# Altium footprint library Connectors.PcbLib: 408 footprints (part 1 of 26)
Each footprint in its own frame and in the unit in brackets; x right, y up, seen from the top. Pads: shape width x height; smd on the part's side, far side on the other; paste and mask are expansions set on the pad; w line width, h text height; cw(c..) or ccw(c..) is an arc to the next point about the centre after c.
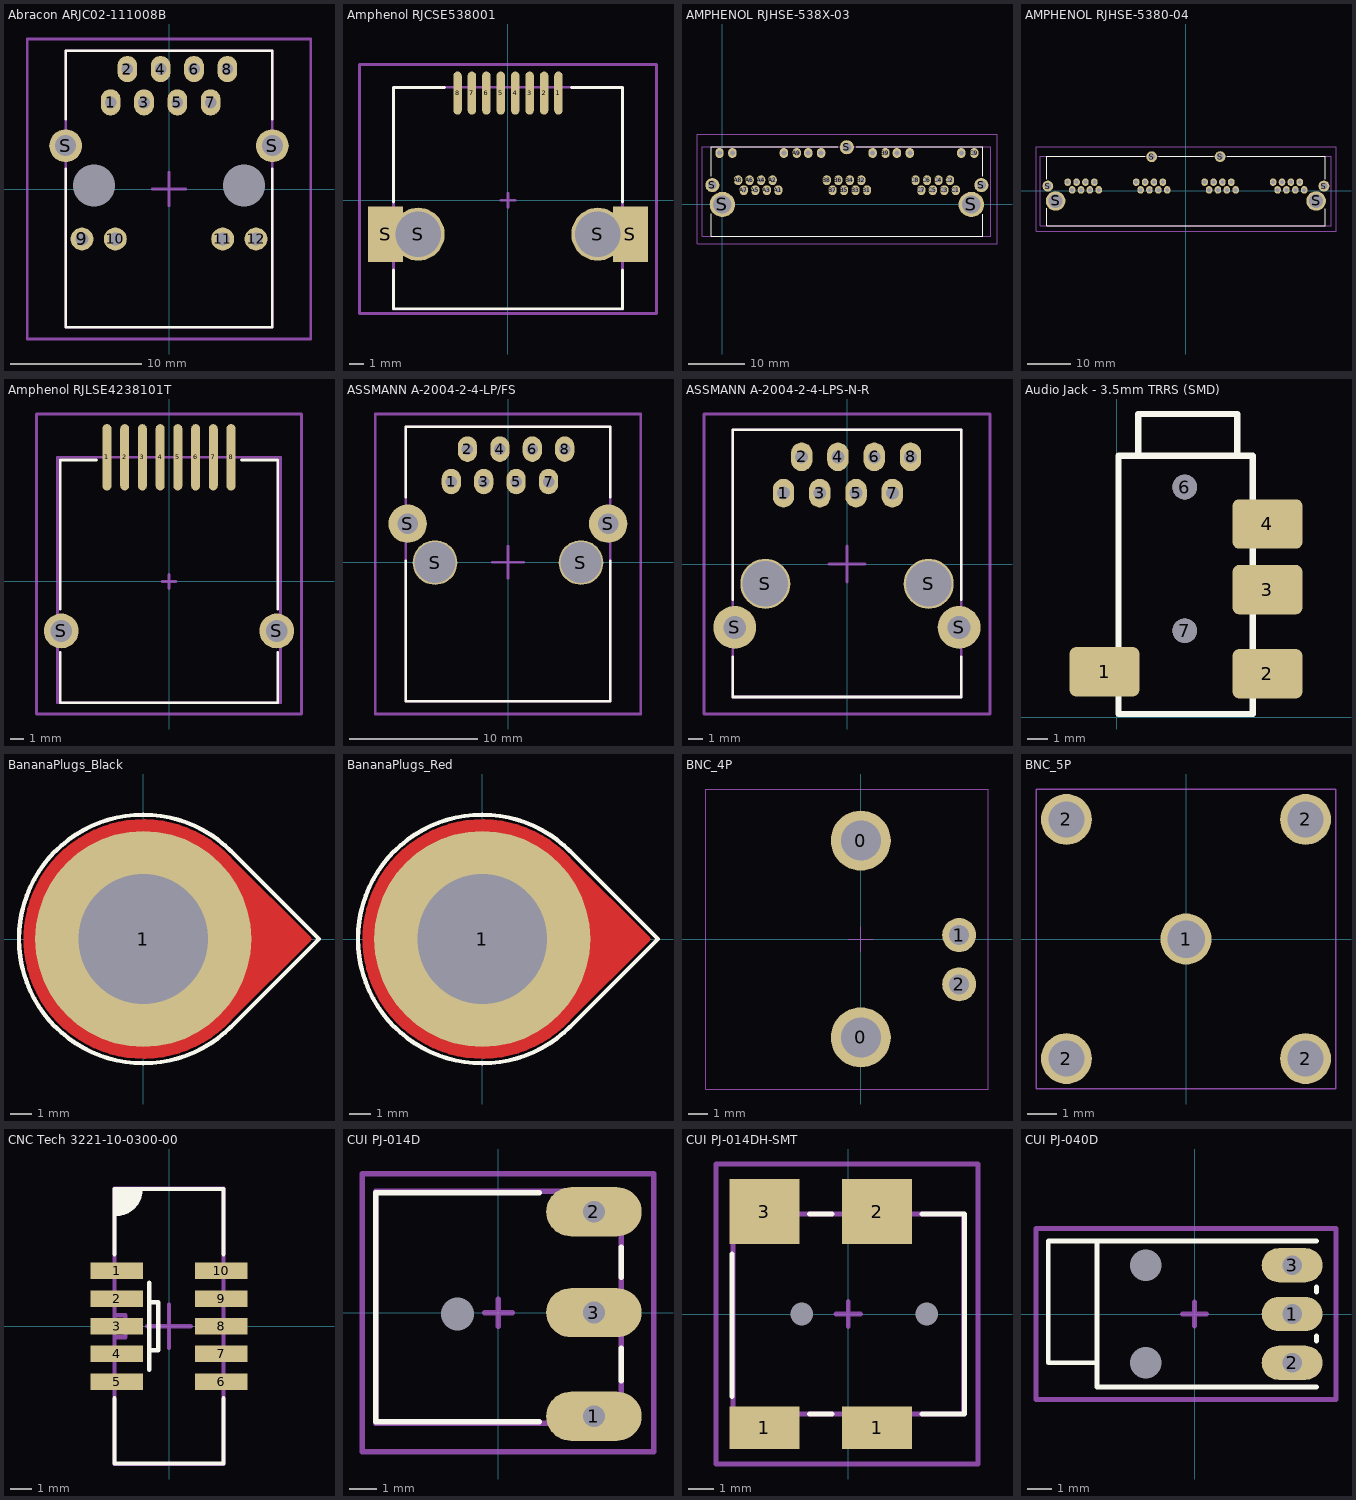
[diagram p0: the footprints below, top view; thin cyan lines are the x and y axes]

## Abracon ARJC02-111008B [mm]
height 13.55
pads (16):
  oval 1.5x2 hole 0.9: 1(-4.445,6.6) 2(-3.175,9.14) 3(-1.905,6.6) 4(-0.635,9.14) 5(0.635,6.6) 6(1.905,9.14) 7(3.175,6.6) 8(4.445,9.14)
  round 1.75 hole 1.02: 9(-6.63,-3.81) 10(-4.09,-3.81) 11(4.09,-3.81) 12(6.63,-3.81)
  round 0 hole 3.2 unplated: M(-5.715,0.25) M(5.715,0.25)
  round 2.5 hole 1.6: S(-7.875,3.3) S(7.875,3.3)
Top Overlay:
  lines w0.2: -7.874,1.52 -7.874,-10.545 0,-10.545 7.874,-10.545 7.874,1.52 ; -7.874,5.33 -7.874,10.537 0,10.537 7.874,10.537 7.874,5.33
Mechanical 1:
  lines w0.2: -7.874,-10.545 7.874,-10.545 7.874,10.537 -7.874,10.537 -7.874,-10.545
Mechanical 15:
  lines w0.2: -1.27,0 1.27,0 ; 0,-1.27 0,1.27 ; -10.795,-11.43 10.795,-11.43 10.795,11.43 -10.795,11.43 -10.795,-11.43
3D body "Abracon ARJC02-111008B.STEP": height 16.07, standoff -3.7, extent -10.336,-10.555 10.336,10.546

## Amphenol RJCSE538001 [mm]
height 13.46
pads (12):
  oval 0.6x3.05 smd: 1(3.57,7.58) 2(2.55,7.58) 3(1.53,7.58) 4(0.51,7.58) 5(-0.51,7.58) 6(-1.53,7.58) 7(-2.55,7.58) 8(-3.57,7.58)
  rect 2.5x3.9 smd: S(-8.66,-2.4) S(8.66,-2.4)
  round 3.75 hole 3.25: S(-6.35,-2.4) S(6.35,-2.4)
Top Overlay:
  lines w0.2: -8.1,-4.92 -8.1,-7.67 0,-7.67 8.1,-7.67 8.1,-4.92 ; -8.1,-0.12 -8.1,7.98 -4.5,7.98 ; 4.5,7.98 8.1,7.98 8.1,-0.12
Mechanical 13:
  lines w0.2: -8.1,-7.7 8.1,-7.7 8.1,8 -8.1,8 -8.1,-7.7
Mechanical 15:
  lines w0.2: -0.5,0 0.5,0 ; 0,-0.5 0,0.5 ; -10.5,-8 -10.5,9.6 10.5,9.6 10.5,-8 -10.5,-8
3D body "Amphenol RJCSE538001.STEP": height 14.77, standoff -1.27, extent -9.43,-7.66 9.43,8.875

## AMPHENOL RJHSE-538X-03 [mm]
height 13.46
pads (41):
  oval 1.5x1.75 hole 0.9: A1(9.93,2.54) A2(8.91,4.32) A3(7.89,2.54) A4(6.87,4.32) A5(5.85,2.54) A6(4.83,4.32) A7(3.81,2.54) A8(2.79,4.32) A9(13.21,9.14) A10(10.92,9.14) A11(1.78,9.14) A12(-0.51,9.14) B1(25.68,2.54) B2(24.66,4.32) B3(23.64,2.54) B4(22.62,4.32) B5(21.6,2.54) B6(20.58,4.32) B7(19.56,2.54) B8(18.54,4.32) B9(28.96,9.14) B10(26.67,9.14) B11(17.53,9.14) B12(15.24,9.14) C1(41.43,2.54) C2(40.41,4.32) C3(39.39,2.54) C4(38.37,4.32) C5(37.35,2.54) C6(36.33,4.32) C7(35.31,2.54) C8(34.29,4.32) C9(44.71,9.14) C10(42.42,9.14) C11(33.28,9.14) C12(30.99,9.14)
  round 2.5 hole 1.57: S(-1.78,3.43) S(22.1,10.16) S(45.98,3.43)
  round 4.5 hole 3.25: S(0,0) S(44.2,0)
Top Overlay:
  lines w0.2: -2,-1.675 -2,-5.65 46.25,-5.65 ; -2,5 -2,10.25 20.5,10.25 ; 23.75,10.25 46.25,10.25 ; 46.26,-5.65 46.26,-1.75 ; 46.26,5 46.26,10.25 ; 20.5,10.25 20.5,10.25
Mechanical 1:
  lines w0.2: 47.67,10.25 -3.525,10.25 -3.525,-5.65 47.686,-5.65 47.686,10.235
Mechanical 15:
  lines w0.2: -4.5,-7 -4.5,12.5 48.76,12.5 48.76,-7 -4.5,-7
3D body "Amphenol RJHSE-538X-03-REVT1.STEP": height 14.47, standoff -4.44, extent -3.345,-6.108 47.825,10.481

## AMPHENOL RJHSE-5380-04 [mm]
height 13.46
pads (38):
  oval 1.5x1.75 hole 0.9: A1(-20.04,0.24) A2(-21.06,2.02) A3(-22.08,0.24) A4(-23.1,2.02) A5(-24.12,0.24) A6(-25.14,2.02) A7(-26.16,0.24) A8(-27.18,2.02) B1(-4.29,0.24) B2(-5.31,2.02) B3(-6.33,0.24) B4(-7.35,2.02) B5(-8.37,0.24) B6(-9.39,2.02) B7(-10.41,0.24) B8(-11.43,2.02) C1(11.46,0.24) C2(10.44,2.02) C3(9.42,0.24) C4(8.4,2.02) C5(7.38,0.24) C6(6.36,2.02) C7(5.34,0.24) C8(4.32,2.02) D1(27.21,0.24) D2(26.19,2.02) D3(25.17,0.24) D4(24.15,2.02) D5(23.13,0.24) D6(22.11,2.02) D7(21.09,0.24) D8(20.07,2.02)
  round 2.5 hole 1.57: S(-31.75,1.13) S(-7.87,7.86) S(7.88,7.89) S(31.75,1.13)
  round 4.5 hole 3.25: S(-29.97,-2.3) S(29.97,-2.3)
Top Overlay:
  lines w0.2: -31.97,-3.975 -31.97,-7.95 32.03,-7.95 32.03,-4.05 ; -31.97,2.7 -31.97,7.95 -9.47,7.95 ; -6.22,7.95 6.28,7.95 ; 9.53,7.95 32.03,7.95 ; 32.03,2.7 32.03,7.95 ; -9.47,7.95 -9.47,7.95 ; 32.03,7.95 32.03,7.95
Mechanical 1:
  lines w0.2: -33.495,-7.95 -33.495,7.95 33.456,7.95 33.456,-7.95 -33.495,-7.95
Mechanical 15:
  lines w0.2: -34.47,-9.3 -34.47,10.2 34.53,10.2 34.53,-9.3 -34.47,-9.3
3D body "Amphenol RJHSE-5380-04-REVT1.STEP": height 14.68, standoff -4.17, extent -33.47,-8 33.481,7.9

## Amphenol RJLSE4238101T [mm] "Surface mount modular jack with shield"
height 11.93
pads (10):
  oval 0.64x4.75 smd: 1(-4.445,8.9) 2(-3.175,8.9) 3(-1.905,8.9) 4(-0.635,8.9) 5(0.635,8.9) 6(1.905,8.9) 7(3.175,8.9) 8(4.445,8.9)
  round 2.5 hole 1.57: S(-7.72,-3.545) S(7.72,-3.545)
Top Overlay:
  lines w0.2: -7.8,-5.1 -7.8,-8.7 0.6,-8.7 7.8,-8.7 7.8,-5.1 ; -7.8,-2 -7.8,8.7 -5.2,8.7 ; 5.2,8.7 7.8,8.7 7.8,-2
Mechanical 13:
  lines w0.2: -8,-8.7 8,-8.7 8,8.9 -8,8.9 -8,-8.7
Mechanical 15:
  lines w0.2: -0.5,0 0.5,0 ; 0,-0.5 0,0.5 ; -9.5,-9.5 0,-9.5 9.5,-9.5 9.5,12 -9.5,12 -9.5,-9.5
3D body "Amphenol RJLSE4238101T.STEP": height 11.76, standoff -2.19, extent -8.051,-8.701 8.049,9.863

## ASSMANN A-2004-2-4-LP/FS [mm]
height 13.3
pads (12):
  oval 1.5x2 hole 0.9: 1(-4.445,6.31) 2(-3.175,8.85) 3(-1.905,6.31) 4(-0.635,8.85) 5(0.635,6.31) 6(1.905,8.85) 7(3.175,6.31) 8(4.445,8.85)
  round 3 hole 1.6: S(-7.855,3.01) S(7.845,3.01)
  round 3.5 hole 3.2: S(-5.715,-0.04) S(5.715,-0.04)
Top Overlay:
  lines w0.2: -8,0.1 -8,-10.9 8,-10.9 8,0.1 ; -8,5.1 -8,10.6 8,10.6 8,5.1
Mechanical 1:
  lines w0.2: -8,-10.9 8,-10.9 8,10.6 -8,10.6 -8,-10.9
Mechanical 15:
  lines w0.2: -1.25,0 1.25,0 ; 0,-1.25 0,1.25 ; -10.4,-11.9 -10.4,11.6 10.4,11.6 10.4,-11.9 -10.4,-11.9
3D body "ASSMANN A-2004-2-4-LPFS-N-R.STEP": height 13.6, standoff -3.5, extent -8,-10.9 8,10.6

## ASSMANN A-2004-2-4-LPS-N-R [mm]
height 13.3
pads (12):
  oval 1.5x2 hole 0.9: 1(-4.445,4.96) 2(-3.175,7.5) 3(-1.905,4.96) 4(-0.635,7.5) 5(0.635,4.96) 6(1.905,7.5) 7(3.175,4.96) 8(4.445,7.5)
  round 3 hole 1.6: S(-7.855,-4.44) S(7.845,-4.44)
  round 3.5 hole 3.2: S(-5.715,-1.39) S(5.715,-1.39)
Top Overlay:
  lines w0.2: -8,-6.5 -8,-9.3 8,-9.3 8,-6.5 ; -8,-2.5 -8,9.4 8,9.4 8,-2.5
Mechanical 1:
  lines w0.2: -8,-9.3 -8,9.4 8,9.4 8,-9.3 -8,-9.3
Mechanical 15:
  lines w0.2: -1.25,0 1.25,0 ; 0,-1.25 0,1.25 ; -10,-10.5 -10,10.5 10,10.5 10,-10.5 -10,-10.5
3D body "ASSMANN A-2004-2-4-LPS-N-R.STEP": height 13.3, standoff -3.5, extent -8,-9.3 8,9.4

## Audio Jack - 3.5mm TRRS (SMD) [mm]
pads (6):
  rrect25% 3.4x2.4 smd: 1(-0.605,2.22) 2(7.335,2.12) 3(7.335,6.22) 4(7.335,9.42)
  round 1.2 hole 1.2 unplated: 6(3.3,11.22) 7(3.3,4.22)
Top Overlay:
  lines w0.305: 1.04,12.904 1.04,14.78 5.865,14.78 5.865,12.904 ; 0.08,0.16 6.62,0.16 6.62,12.75 0.08,12.75 0.08,0.16
3D body "User Library-3_5mm_Audio_Jack.STEP": height 5.1, standoff -0.8, extent -1.21,0.35 7.94,14.65

## BananaPlugs_Black [mil]
pads (1):
  round 400 hole 240: 1(0,0)
Top Layer:
  region: 158.64,-146.59 148.87,-157.16 126.7,-175.53 102.29,-190.79 76.06,-202.68 48.5,-210.98 20.07,-215.55 -8.71,-216.3 -37.33,-213.24 -65.3,-206.4 -92.11,-195.9 -117.29,-181.95 -140.4,-164.78 -161.02,-144.69 -178.8,-122.04 -193.41,-97.23 -204.61,-70.71 -212.18,-42.93 -216,-14.4 -216,14.4 -212.18,42.93 -204.61,70.71 -193.41,97.23 -178.8,122.04 -161.02,144.69 -140.4,164.78 -117.29,181.95 -92.11,195.9 -65.3,206.4 -37.33,213.24 -8.71,216.3 20.07,215.55 48.5,210.98 76.06,202.68 102.29,190.79 126.7,175.53 148.87,157.16 158.64,146.59 159,146 305,0
  lines w12: 158.64,-146.59 cw(c0,0) 158.64,146.59 ; 159,-146 305,0 159,146
Bottom Layer:
  region: 158.64,-146.59 148.87,-157.16 126.7,-175.53 102.29,-190.79 76.07,-202.68 48.5,-210.98 20.07,-215.55 -8.71,-216.3 -37.33,-213.24 -65.3,-206.4 -92.11,-195.9 -117.29,-181.95 -140.4,-164.78 -161.02,-144.69 -178.8,-122.04 -193.41,-97.23 -204.61,-70.71 -212.18,-42.93 -216,-14.4 -216,14.4 -212.18,42.93 -204.61,70.71 -193.41,97.23 -178.8,122.04 -161.02,144.69 -140.4,164.78 -117.29,181.95 -92.11,195.9 -65.3,206.4 -37.33,213.24 -8.71,216.3 20.07,215.55 48.5,210.98 76.07,202.68 102.29,190.79 126.7,175.53 148.87,157.16 158.64,146.59 159,146 305,0
Top Overlay:
  lines w8: 162.63,-162.63 cw(c0,0) 162.63,162.63 325.27,0 162.63,-162.63
Bottom Overlay:
  lines w8: 162.63,-162.63 cw(c0,0) 162.63,162.63 325.27,0 162.63,-162.63
Top Solder:
  region: 158.64,-146.59 148.87,-157.16 126.7,-175.53 102.29,-190.79 76.07,-202.68 48.5,-210.98 20.07,-215.55 -8.71,-216.3 -37.33,-213.24 -65.3,-206.4 -92.11,-195.9 -117.29,-181.95 -140.4,-164.78 -161.02,-144.69 -178.8,-122.04 -193.41,-97.23 -204.61,-70.71 -212.18,-42.93 -216,-14.4 -216,14.4 -212.18,42.93 -204.61,70.71 -193.41,97.23 -178.8,122.04 -161.02,144.69 -140.4,164.78 -117.29,181.95 -92.11,195.9 -65.3,206.4 -37.33,213.24 -8.71,216.3 20.07,215.55 48.5,210.98 76.07,202.68 102.29,190.79 126.7,175.53 148.87,157.16 158.64,146.59 159,146 305,0
Bottom Solder:
  region: 158.64,-146.59 148.87,-157.16 126.7,-175.53 102.29,-190.79 76.07,-202.68 48.5,-210.98 20.07,-215.55 -8.71,-216.3 -37.33,-213.24 -65.3,-206.4 -92.11,-195.9 -117.29,-181.95 -140.4,-164.78 -161.02,-144.69 -178.8,-122.04 -193.41,-97.23 -204.61,-70.71 -212.18,-42.93 -216,-14.4 -216,14.4 -212.18,42.93 -204.61,70.71 -193.41,97.23 -178.8,122.04 -161.02,144.69 -140.4,164.78 -117.29,181.95 -92.11,195.9 -65.3,206.4 -37.33,213.24 -8.71,216.3 20.07,215.55 48.5,210.98 76.07,202.68 102.29,190.79 126.7,175.53 148.87,157.16 158.64,146.59 159,146 305,0
3D body "User Library-ST-351B V1 - BLACK.STEP": height 326.77, standoff -303.18, extent -222.44,-222.19 456.69,222.19

## BananaPlugs_Red [mil]
pads (1):
  round 400 hole 240: 1(0,0)
Top Layer:
  region: 158.64,-146.59 148.87,-157.16 126.7,-175.53 102.29,-190.79 76.06,-202.68 48.5,-210.98 20.07,-215.55 -8.71,-216.3 -37.33,-213.24 -65.3,-206.4 -92.11,-195.9 -117.29,-181.95 -140.4,-164.78 -161.02,-144.69 -178.8,-122.04 -193.41,-97.23 -204.61,-70.71 -212.18,-42.93 -216,-14.4 -216,14.4 -212.18,42.93 -204.61,70.71 -193.41,97.23 -178.8,122.04 -161.02,144.69 -140.4,164.78 -117.29,181.95 -92.11,195.9 -65.3,206.4 -37.33,213.24 -8.71,216.3 20.07,215.55 48.5,210.98 76.06,202.68 102.29,190.79 126.7,175.53 148.87,157.16 158.64,146.59 159,146 305,0
  lines w12: 158.64,-146.59 cw(c0,0) 158.64,146.59 ; 159,-146 305,0 159,146
Bottom Layer:
  region: 158.64,-146.59 148.87,-157.16 126.7,-175.53 102.29,-190.79 76.07,-202.68 48.5,-210.98 20.07,-215.55 -8.71,-216.3 -37.33,-213.24 -65.3,-206.4 -92.11,-195.9 -117.29,-181.95 -140.4,-164.78 -161.02,-144.69 -178.8,-122.04 -193.41,-97.23 -204.61,-70.71 -212.18,-42.93 -216,-14.4 -216,14.4 -212.18,42.93 -204.61,70.71 -193.41,97.23 -178.8,122.04 -161.02,144.69 -140.4,164.78 -117.29,181.95 -92.11,195.9 -65.3,206.4 -37.33,213.24 -8.71,216.3 20.07,215.55 48.5,210.98 76.07,202.68 102.29,190.79 126.7,175.53 148.87,157.16 158.64,146.59 159,146 305,0
Top Overlay:
  lines w8: 162.63,-162.63 cw(c0,0) 162.63,162.63 325.27,0 162.63,-162.63
Bottom Overlay:
  lines w8: 162.63,-162.63 cw(c0,0) 162.63,162.63 325.27,0 162.63,-162.63
Top Solder:
  region: 158.64,-146.59 148.87,-157.16 126.7,-175.53 102.29,-190.79 76.07,-202.68 48.5,-210.98 20.07,-215.55 -8.71,-216.3 -37.33,-213.24 -65.3,-206.4 -92.11,-195.9 -117.29,-181.95 -140.4,-164.78 -161.02,-144.69 -178.8,-122.04 -193.41,-97.23 -204.61,-70.71 -212.18,-42.93 -216,-14.4 -216,14.4 -212.18,42.93 -204.61,70.71 -193.41,97.23 -178.8,122.04 -161.02,144.69 -140.4,164.78 -117.29,181.95 -92.11,195.9 -65.3,206.4 -37.33,213.24 -8.71,216.3 20.07,215.55 48.5,210.98 76.07,202.68 102.29,190.79 126.7,175.53 148.87,157.16 158.64,146.59 159,146 305,0
Bottom Solder:
  region: 158.64,-146.59 148.87,-157.16 126.7,-175.53 102.29,-190.79 76.07,-202.68 48.5,-210.98 20.07,-215.55 -8.71,-216.3 -37.33,-213.24 -65.3,-206.4 -92.11,-195.9 -117.29,-181.95 -140.4,-164.78 -161.02,-144.69 -178.8,-122.04 -193.41,-97.23 -204.61,-70.71 -212.18,-42.93 -216,-14.4 -216,14.4 -212.18,42.93 -204.61,70.71 -193.41,97.23 -178.8,122.04 -161.02,144.69 -140.4,164.78 -117.29,181.95 -92.11,195.9 -65.3,206.4 -37.33,213.24 -8.71,216.3 20.07,215.55 48.5,210.98 76.07,202.68 102.29,190.79 126.7,175.53 148.87,157.16 158.64,146.59 159,146 305,0
3D body "User Library-ST-351A V1 - RED.STEP": height 326.77, standoff -303.18, extent -222.45,-222.2 456.69,222.18

## BNC_4P [mil]
pads (4):
  round 120 hole 80: 0(0,-196.85) 0(0,196.85)
  round 68 hole 40: 1(196.85,7.87) 2(196.85,-90.55)
Mechanical 13:
  lines w2: -25,0 25,0 ; 0,-25 0,25
Mechanical 14:
  lines w2: -310,-300 -310,300 255,300 255,-300 -310,-300
3D body "User Library-BNC-144.STEP": height 519.2, standoff -161.8, extent -1124.99,-290.5 250.01,290.5

## BNC_5P [mil]
pads (5):
  round 68 hole 50: 1(0,0)
  round 68 hole 48: 2(-159.45,-159.45) 2(-159.45,159.45) 2(159.45,-159.45) 2(159.45,159.45)
Mechanical 14:
  lines w2: -200,-200 -200,200 200,200 200,-200 -200,-200
3D body "User Library-BNC84CT-9000.STEP": height 600.39, standoff -177.17, extent -216.53,-216.53 1043.31,216.54

## CNC Tech 3221-10-0300-00 [mm]
height 5.6
pads (10):
  rect 2.4x0.76 smd: 1(-2.4,2.54) 2(-2.4,1.27) 3(-2.4,0) 4(-2.4,-1.27) 5(-2.4,-2.54) 6(2.4,-2.54) 7(2.4,-1.27) 8(2.4,0) 9(2.4,1.27) 10(2.4,2.54)
Top Overlay:
  region: -1.3,6.3 -1.3,5.9 -2.05,5.15 -2.45,5.15 -2.45,6.25 -2.5,6.3
  lines w0.2: -2.5,-3.3 -2.5,-6.3 2.5,-6.3 2.5,-3.3 ; -2.5,3.3 -2.5,6.3 ; -2.5,5.15 -2.45,5.15 ccw(c-2.45,6.3) -1.3,6.3 ; -2.3,6.3 -2.5,6.3 ; -0.9,-2 -0.9,-1.1 ; -0.9,2 -0.9,1.1 ; 2.5,3.3 2.5,6.3 -2.5,6.3 ; -0.9,-1.1 -0.9,1.1 ; -0.9,-1.1 -0.5,-1.1 -0.5,1.1 -0.9,1.1
Mechanical 1:
  lines w0.2: -2.45,-0.5 -2,-0.5 -2,0 -2,0.5 -2.45,0.5 ; -2.5,-6.325 -2.5,6.325 2.5,6.325 2.5,-6.325 -2.5,-6.325
Mechanical 15:
  lines w0.2: -1,0 1,0 ; 0,-1 0,1
3D body "CNC Tech 3221-10-0300-00.STEP": height 5.6, standoff 0, extent -2.75,-6.325 2.75,6.325

## CUI PJ-014D [mm]
height 5.5
pads (4):
  oval 3.5x1.8 hole 0.8 square: 1(3.5,-3.8) 2(3.5,3.7) 3(3.5,0)
  round 0 hole 1.2 unplated: M(-1.5,-0.05)
Top Overlay:
  lines w0.2: 1.5,-4 -4.5,-4 -4.5,4.4 1.5,4.4 ; 4.5,-2.5 4.5,-1.3 ; 4.5,1.3 4.5,2.4
Mechanical 1:
  lines w0.2: -4.5,-4.05 4.5,-4.05 4.5,4.45 -4.5,4.45 -4.5,-4.05
Mechanical 15:
  lines w0.2: -0.5,0 0.5,0 ; 0,-0.5 0,0.5 ; -5,-5.1 5.7,-5.1 5.7,5.1 -5,5.1 -5,-5.1
3D body "CUI PJ-014D.STEP": height 5.5, standoff -3.5, extent -4.5,-4.05 4.5,4.45

## CUI PJ-014DH-SMT [mm]
height 5.7
pads (6):
  rect 2.8x1.7 smd: 1(-3.35,-4.55) 1(1.15,-4.55)
  rect 2.8x2.6 smd: 2(1.15,4.1) 3(-3.35,4.1)
  round 0 hole 0.9 unplated: M(-1.85,0) M(3.15,0)
Top Overlay:
  lines w0.2: -4.65,-3.3 -4.65,2.4 ; -1.55,-4 -0.65,-4 ; -1.55,4 -0.65,4 ; 2.95,-4 4.65,-4 4.65,4 2.95,4
Mechanical 1:
  lines w0.2: -4.6,-4 4.6,-4 4.6,4 -4.6,4 -4.6,-4
Mechanical 15:
  lines w0.2: -0.5,0 0.5,0 ; 0,-0.5 0,0.5 ; -5.3,-6 -5.3,6 5.2,6 5.2,-6 -5.3,-6
3D body "CUI PJ-014DH-SMT.STEP": height 5.4, standoff -0.6, extent -4.65,-4.8 4.65,4.8

## CUI PJ-040D [mm]
height 5
pads (5):
  oval 2.5x1.4 hole 0.8 square: 1(4,0) 2(4,-2) 3(4,2)
  round 0 hole 1.3 unplated: M(-2,-2) M(-2,2)
Top Overlay:
  lines w0.2: -4,3 -4,-2 ; 5,-3 -4,-3 -4,-2 ; 5,-1.1 5,-0.9 ; 5,0.9 5,1.1 ; 5,3 -6,3 -6,-2 -4,-2
Mechanical 15:
  lines w0.2: -0.5,0 0.5,0 ; 0,-0.5 0,0.5 ; -6.5,-3.5 5.8,-3.5 5.8,3.5 -6.5,3.5 -6.5,-3.5
3D body "CUI pj-040d.STEP": height 5, standoff -3, extent -6,-3 5,3